# Altium footprint library JL_PCB.PCBLIB: 1112 footprints (part 21 of 71)
Each footprint in its own frame and in the unit in brackets; x right, y up, seen from the top. Pads: shape width x height; smd on the part's side, far side on the other; paste and mask are expansions set on the pad; w line width, h text height; cw(c..) or ccw(c..) is an arc to the next point about the centre after c.
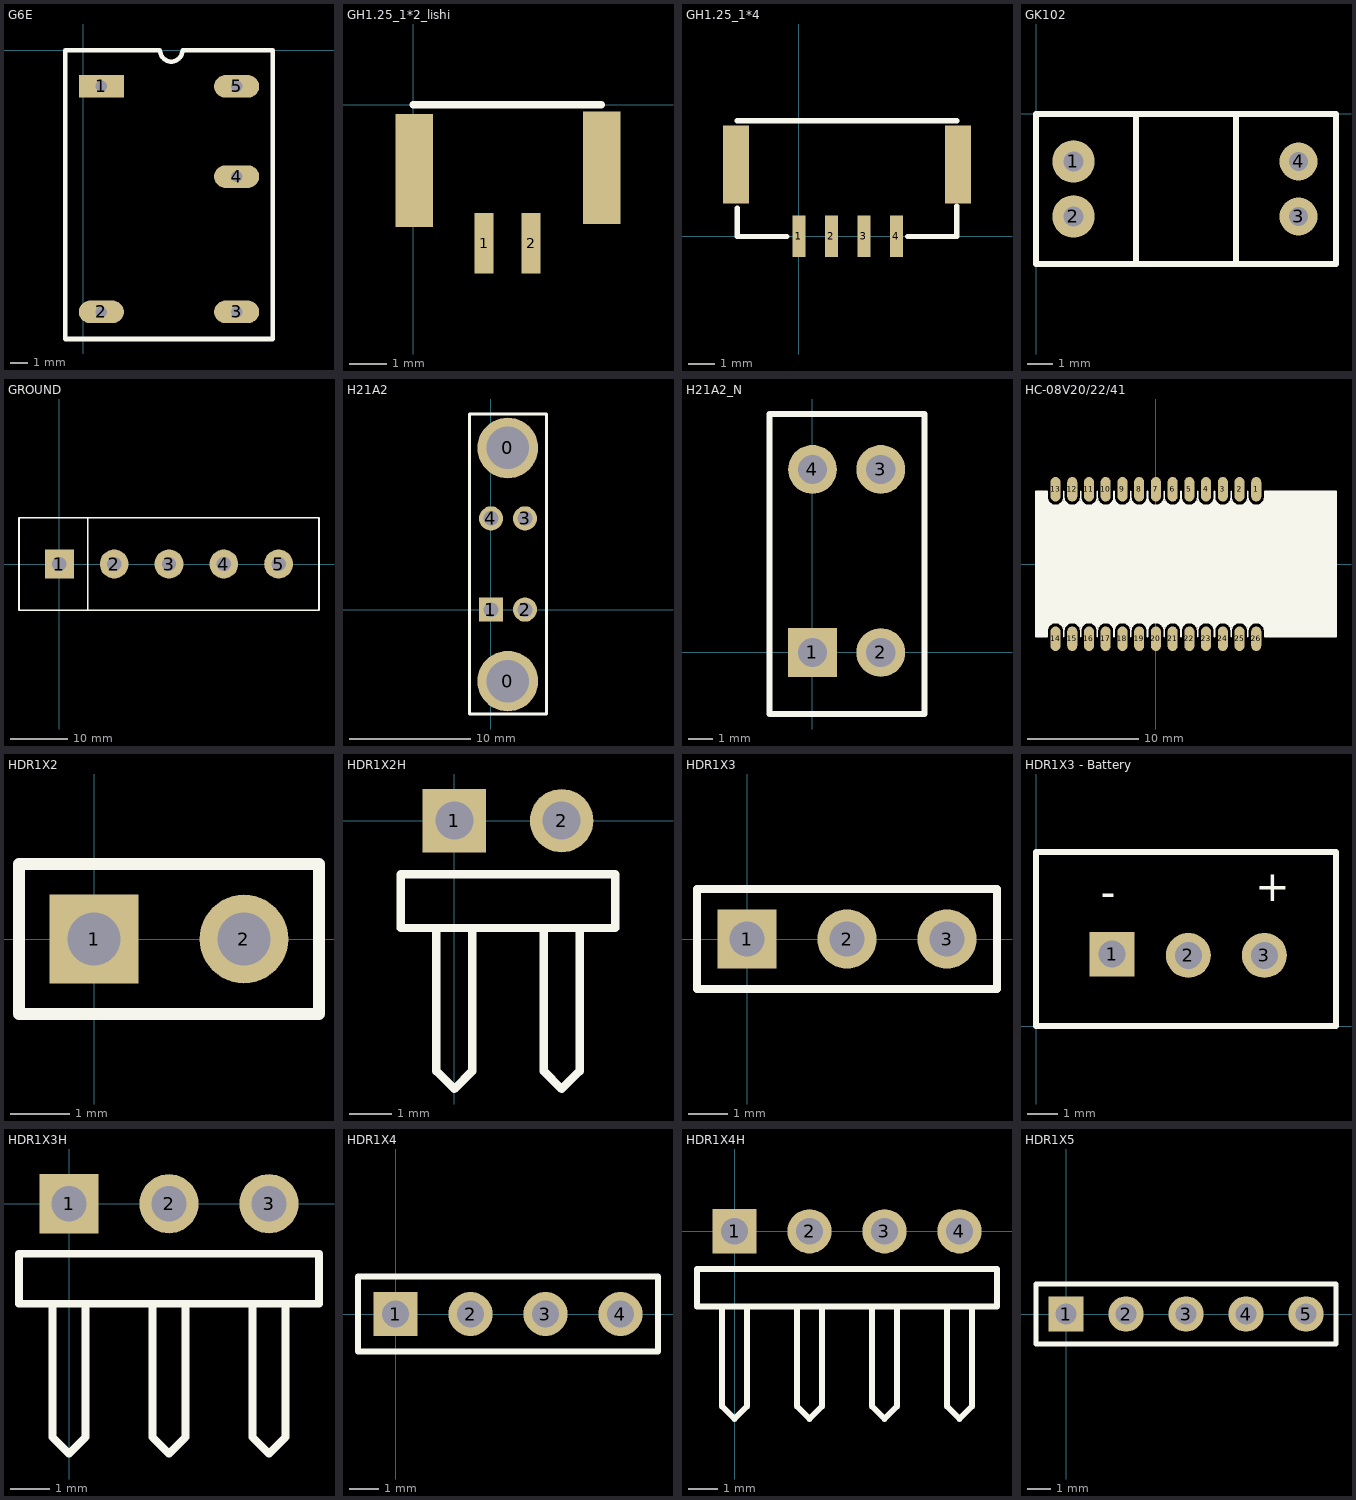
[diagram p20: the footprints below, top view; thin cyan lines are the x and y axes]

## G6E [mil]
pads (5):
  rect 100x50 hole 25: 1(40,-80)
  oval 100x50 hole 25: 2(40,-580) 3(340,-580) 4(340,-280) 5(340,-80)
TopOverlay:
  lines w10: -40,-640 420,-640 420,0 220,0 cw(c195,0) 170,0 160,0 -40,0 -40,-640

## GH1.25_1*2_lishi [mm]
pads (4):
  rect 0.5x1.6 smd: 1(1.88,-3.683) 2(3.13,-3.683)
  rect 1x3 smd: ""(0.025,-1.753) ""(5.004,-1.676)
TopOverlay:
  lines w0.2: 0,0 5,0

## GH1.25_1*4 [mm]
pads (6):
  rect 0.5x1.6 smd: 1(0,0) 2(1.25,0) 3(2.5,0) 4(3.75,0)
  rect 1x3 smd: ""(-2.413,2.769) ""(6.121,2.769)
TopOverlay:
  lines w0.2: -2.362,1.092 -2.362,0 -0.457,0 ; -2.362,4.445 6.071,4.445 ; 4.191,0 6.071,0 6.071,1.168

## GK102 [mm]
pads (4):
  round 1.7 hole 0.8: 1(1.5,-1.9) 2(1.5,-4.1)
  round 1.524 hole 0.762: 3(10.5,-4.1) 4(10.5,-1.9)
TopOverlay:
  lines w0.254: 4,-6 4,0 ; 8,-6 8,0 ; 0,-6 0,0 12,0 12,-6 0,-6

## GROUND [mm]
pads (5):
  rect 5x5 hole 2.5: 1(0,0)
  round 5 hole 2.5: 2(9.5,0) 3(19,0) 4(28.5,0) 5(38,0)
TopOverlay:
  lines w0.254: -7,-8 45,-8 ; -7,8 45,8
  lines w0.305: -7,-8 -7,8 ; 4.9,-8 4.9,8 ; 45,-8 45,8

## H21A2 [mm]
pads (6):
  round 5 hole 3.5: 0(1.385,-5.894) 0(1.385,13.306)
  rect 2x2 hole 1.2: 1(0,0)
  round 2 hole 1.2: 2(2.8,0) 3(2.8,7.5) 4(0,7.5)
TopOverlay:
  lines w0.254: -1.775,-8.6 -1.775,16.1 4.575,16.1 4.575,-8.6 -1.775,-8.6
3D body "User Library-h21a1.step": height 11.2, standoff -2, extent -1.854,-8.591 4.496,16.109

## H21A2_N [mm]
pads (4):
  rect 2x2 hole 1.2: 1(0,0)
  round 2 hole 1.2: 2(2.8,0) 3(2.8,7.5) 4(0,7.5)
TopOverlay:
  lines w0.254: -1.76,-2.52 -1.76,9.77 4.59,9.77 4.59,-2.52 -1.76,-2.52

## HC-08V20/22/41 [mm]
pads (26):
  oval 0.9x2.2 smd: 1(9,6.7) 2(7.5,6.7) 3(6,6.7) 4(4.5,6.7) 5(3,6.7) 6(1.5,6.7) 7(0,6.7) 8(-1.5,6.7) 9(-3,6.7) 10(-4.5,6.7) 11(-6,6.7) 12(-7.5,6.7) 13(-9,6.7) 14(-9,-6.7) 15(-7.5,-6.7) 16(-6,-6.7) 17(-4.5,-6.7) 18(-3,-6.7) 19(-1.5,-6.7) 20(0,-6.7) 21(1.5,-6.7) 22(3,-6.7) 23(4.5,-6.7) 24(6,-6.7) 25(7.5,-6.7) 26(9,-6.7)
TopOverlay:
  rectangle: -8.6,5.275 -7.9,5.425
  rectangle: -8.41,5.4 -8.09,5.66
  rectangle: -7.1,5.275 -6.4,5.425
  rectangle: -6.91,5.4 -6.59,5.66
  rectangle: -5.6,5.275 -4.9,5.425
  rectangle: -5.41,5.4 -5.09,5.66
  rectangle: -4.1,5.275 -3.4,5.425
  rectangle: -3.91,5.4 -3.59,5.66
  rectangle: -2.6,5.275 -1.9,5.425
  rectangle: -2.41,5.4 -2.09,5.66
  rectangle: -1.1,5.275 -0.4,5.425
  rectangle: -0.91,5.4 -0.59,5.66
  rectangle: 0.4,5.275 1.1,5.425
  rectangle: 0.59,5.4 0.91,5.66
  rectangle: 1.9,5.275 2.6,5.425
  rectangle: 2.09,5.4 2.41,5.66
  rectangle: 3.4,5.275 4.1,5.425
  rectangle: 3.59,5.4 3.91,5.66
  rectangle: 4.9,5.275 5.6,5.425
  rectangle: 5.09,5.4 5.41,5.66
  rectangle: 6.4,5.275 7.1,5.425
  rectangle: 6.59,5.4 6.91,5.66
  rectangle: 7.9,5.275 8.6,5.425
  rectangle: 8.09,5.4 8.41,5.66
  rectangle: 9.4,5.275 10.1,5.425
  rectangle: 9.59,5.4 9.91,5.66
  rectangle: -8.6,-5.425 -7.9,-5.275
  rectangle: -8.41,-5.66 -8.09,-5.4
  rectangle: -7.1,-5.425 -6.4,-5.275
  rectangle: -6.91,-5.66 -6.59,-5.4
  rectangle: -5.6,-5.425 -4.9,-5.275
  rectangle: -5.41,-5.66 -5.09,-5.4
  rectangle: -4.1,-5.425 -3.4,-5.275
  rectangle: -3.91,-5.66 -3.59,-5.4
  rectangle: -2.6,-5.425 -1.9,-5.275
  rectangle: -2.41,-5.66 -2.09,-5.4
  rectangle: -1.1,-5.425 -0.4,-5.275
  rectangle: -0.91,-5.66 -0.59,-5.4
  rectangle: 0.4,-5.425 1.1,-5.275
  rectangle: 0.59,-5.66 0.91,-5.4
  rectangle: 1.9,-5.425 2.6,-5.275
  rectangle: 2.09,-5.66 2.41,-5.4
  rectangle: 3.4,-5.425 4.1,-5.275
  rectangle: 3.59,-5.66 3.91,-5.4
  rectangle: 4.9,-5.425 5.6,-5.275
  rectangle: 5.09,-5.66 5.41,-5.4
  rectangle: 6.4,-5.425 7.1,-5.275
  rectangle: 6.59,-5.66 6.91,-5.4
  rectangle: 7.9,-5.425 8.6,-5.275
  rectangle: 8.09,-5.66 8.41,-5.4
  rectangle: 9.4,-5.425 10.1,-5.275
  rectangle: 9.59,-5.66 9.91,-5.4
  rectangle: -10.75,-6.5 -9.75,6.5
  rectangle: 9.75,-6.5 16.15,6.5
  rectangle: -9.75,-5.3 9.75,5.3
  rectangle: -9.75,5.3 -9.425,5.475
  rectangle: -9.75,5.475 -9.6,5.675
  rectangle: -9.75,-5.475 -9.425,-5.3
  rectangle: -9.75,-5.675 -9.6,-5.475
  lines w0.152: -8.25,-5.85 -8.25,-6.5 -8.25,-6 ; 9.75,-6 ccw(c9,-6) 8.25,-6 ccw(c7.5,-6) 6.75,-6 ccw(c6,-6) 5.25,-6 ccw(c4.5,-6) 3.75,-6 ccw(c3,-6) 2.25,-6 ccw(c1.5,-6) 0.75,-6 ccw(c0,-6) -0.75,-6 ccw(c-1.5,-6) -2.25,-6 ccw(c-3,-6) -3.75,-6 ccw(c-4.5,-6) -5.25,-6 ccw(c-6,-6) -6.75,-6 ccw(c-7.5,-6) -8.25,-6 ; 9.75,-5.85 9.75,-6.5 16.15,-6.5 16.15,6.5 9.75,6.5 9.75,6 cw(c9,6) 8.25,6 ; -8.25,-6 ccw(c-9,-6) -9.75,-6 -9.75,-6.5 -10.75,-6.5 -10.75,6.5 -9.75,6.5 -9.75,6 ccw(c-9,6) -8.25,6 ; -8.25,6 ccw(c-7.5,6) -6.75,6 ; -8.25,6 -8.25,6.5 -8.25,6 ; -6.75,6 ccw(c-6,6) -5.25,6 ; -6.75,6 -6.75,6.5 -6.75,6 ; -5.25,6 ccw(c-4.5,6) -3.75,6 ; -5.25,6 -5.25,6.5 -5.25,6 ; -3.75,6 ccw(c-3,6) -2.25,6 ; -3.75,6 -3.75,6.5 -3.75,6 ; -2.25,6 ccw(c-1.5,6) -0.75,6 ; -2.25,6 -2.25,6.5 -2.25,6 ; -0.75,6 ccw(c0,6) 0.75,6 ; -0.75,6 -0.75,6.5 -0.75,6 ; 0.75,6 ccw(c1.5,6) 2.25,6 ; 0.75,6 0.75,6.5 0.75,6 ; 2.25,6 ccw(c3,6) 3.75,6 ; 2.25,6 2.25,6.5 2.25,6 ; 3.75,6 ccw(c4.5,6) 5.25,6 ; 3.75,6 3.75,6.5 3.75,6 ; 5.25,6 ccw(c6,6) 6.75,6 ; 5.25,6 5.25,6.5 5.25,6 ; 6.75,6 ccw(c7.5,6) 8.25,6 ; 6.75,6 6.75,6.5 6.75,6 ; 8.25,6 8.25,6.5 8.25,6 ; -6.75,-6.5 -6.75,-5.85 -6.75,-6.5 ; -5.25,-6.5 -5.25,-5.85 -5.25,-6.5 ; -3.75,-6.5 -3.75,-5.85 -3.75,-6.5 ; -2.25,-6.5 -2.25,-5.85 -2.25,-6.5 ; -0.75,-6.5 -0.75,-5.85 -0.75,-6.5 ; 0.75,-6.5 0.75,-5.85 0.75,-6.5 ; 2.25,-6.5 2.25,-5.85 2.25,-6.5 ; 3.75,-6.5 3.75,-5.85 3.75,-6.5 ; 5.25,-6.5 5.25,-5.85 5.25,-6.5 ; 6.75,-6.5 6.75,-5.85 6.75,-6.5 ; 8.25,-6.5 8.25,-5.85 8.25,-6.5

## HDR1X2 [mm] "Connector; Header; 2 Position"
pads (2):
  rect 1.5x1.5 hole 0.9: 1(0,0)
  round 1.5 hole 0.9: 2(2.54,0)
TopOverlay:
  lines w0.2: -1.27,-1.27 -1.27,1.27 3.81,1.27 3.81,-1.27 -1.27,-1.27
3D body "HEADER.STEP": height 7.58, standoff -2.94, extent 1.27,-1.27 3.81,1.27
3D body "HEADER.STEP": height 7.58, standoff -2.94, extent -1.27,-1.27 1.27,1.27

## HDR1X2H [mm] "Connector; Header; 2 Position; Right Angle"
pads (2):
  rect 1.5x1.5 hole 0.9: 1(0,0)
  round 1.5 hole 0.9: 2(2.54,0)
TopOverlay:
  lines w0.2: -0.423,-2.54 -0.423,-5.927 0,-6.35 0.423,-5.927 0.423,-2.54 ; 2.117,-2.54 2.117,-5.927 2.54,-6.35 2.963,-5.927 2.963,-2.54 ; -1.27,-2.54 -1.27,-1.27 3.81,-1.27 3.81,-2.54 -1.27,-2.54

## HDR1X3 [mm] "Connector; Header; 3 Position"
pads (3):
  rect 1.5x1.5 hole 0.9: 1(0,0)
  round 1.5 hole 0.9: 2(2.54,0) 3(5.08,0)
TopOverlay:
  lines w0.2: -1.27,-1.27 -1.27,1.27 6.35,1.27 6.35,-1.27 -1.27,-1.27
3D body "HEADER.STEP": height 7.58, standoff -2.94, extent -1.27,-1.27 1.27,1.27
3D body "HEADER.STEP": height 7.58, standoff -2.94, extent 1.27,-1.27 3.81,1.27
3D body "HEADER.STEP": height 7.58, standoff -2.94, extent 3.81,-1.27 6.35,1.27

## HDR1X3 - Battery [mm] "Connector; Header; 3 Position"
pads (3):
  rect 1.5x1.5 hole 0.9: 1(2.54,2.4)
  round 1.5 hole 0.9: 2(5.08,2.362) 3(7.62,2.362)
TopOverlay:
  lines w0.2: 0,5.8 0,0 10,0 ; 0,5.817 10,5.817 ; 10.008,0 10.008,5.8
  text "-" at 2.159,3.988 h1.02
  text "+" at 7.315,4.166 h1.02
3D body "HEADER.STEP": height 7.58, standoff -2.94, extent 6.35,1.092 8.89,3.632
3D body "HEADER.STEP": height 7.58, standoff -2.94, extent 3.81,1.092 6.35,3.632
3D body "HEADER.STEP": height 7.58, standoff -2.94, extent 1.27,1.092 3.81,3.632

## HDR1X3H [mm] "Connector; Header; 3 Position; Right Angle"
pads (3):
  rect 1.5x1.5 hole 0.9: 1(0,0)
  round 1.5 hole 0.9: 2(2.54,0) 3(5.08,0)
TopOverlay:
  lines w0.2: -0.423,-2.54 -0.423,-5.927 0,-6.35 0.423,-5.927 0.423,-2.54 ; 2.117,-2.54 2.117,-5.927 2.54,-6.35 2.963,-5.927 2.963,-2.54 ; 4.657,-2.54 4.657,-5.927 5.08,-6.35 5.503,-5.927 5.503,-2.54 ; -1.27,-2.54 -1.27,-1.27 6.35,-1.27 6.35,-2.54 -1.27,-2.54

## HDR1X4 [mm] "Connector; Header; 4 Position"
pads (4):
  rect 1.5x1.5 hole 0.9: 1(0,0)
  round 1.5 hole 0.9: 2(2.54,0) 3(5.08,0) 4(7.62,0)
TopOverlay:
  lines w0.2: -1.27,-1.27 8.89,-1.27 8.89,1.27 -1.27,1.27 -1.27,-1.27
3D body "HEADER.STEP": height 7.58, standoff -2.94, extent 6.35,-1.27 8.89,1.27
3D body "HEADER.STEP": height 7.58, standoff -2.94, extent 3.81,-1.27 6.35,1.27
3D body "HEADER.STEP": height 7.58, standoff -2.94, extent 1.27,-1.27 3.81,1.27
3D body "HEADER.STEP": height 7.58, standoff -2.94, extent -1.27,-1.27 1.27,1.27

## HDR1X4H [mm] "Connector; Header; 4 Position; Right Angle"
pads (4):
  rect 1.5x1.5 hole 0.9: 1(0,0)
  round 1.5 hole 0.9: 2(2.54,0) 3(5.08,0) 4(7.62,0)
TopOverlay:
  lines w0.2: -0.423,-2.54 -0.423,-5.927 0,-6.35 0.423,-5.927 0.423,-2.54 ; 2.117,-2.54 2.117,-5.927 2.54,-6.35 2.963,-5.927 2.963,-2.54 ; 4.657,-2.54 4.657,-5.927 5.08,-6.35 5.503,-5.927 5.503,-2.54 ; 7.197,-2.54 7.197,-5.927 7.62,-6.35 8.043,-5.927 8.043,-2.54 ; -1.27,-2.54 -1.27,-1.27 8.89,-1.27 8.89,-2.54 -1.27,-2.54

## HDR1X5 [mm] "Connector; Header; 5 Position"
pads (5):
  rect 1.5x1.5 hole 0.9: 1(0,0)
  round 1.5 hole 0.9: 2(2.54,0) 3(5.08,0) 4(7.62,0) 5(10.16,0)
TopOverlay:
  lines w0.2: -1.27,-1.27 11.43,-1.27 11.43,1.27 -1.27,1.27 -1.27,-1.27
3D body "HEADER.STEP": height 7.58, standoff -2.94, extent 8.89,-1.27 11.43,1.27
3D body "HEADER.STEP": height 7.58, standoff -2.94, extent 6.35,-1.27 8.89,1.27
3D body "HEADER.STEP": height 7.58, standoff -2.94, extent 3.81,-1.27 6.35,1.27
3D body "HEADER.STEP": height 7.58, standoff -2.94, extent 1.27,-1.27 3.81,1.27
3D body "HEADER.STEP": height 7.58, standoff -2.94, extent -1.27,-1.27 1.27,1.27